# Altium footprint library XTL.PcbLib: 40 footprints (part 1 of 3)
Each footprint in its own frame and in the unit in brackets; x right, y up, seen from the top. Pads: shape width x height; smd on the part's side, far side on the other; paste and mask are expansions set on the pad; w line width, h text height; cw(c..) or ccw(c..) is an arc to the next point about the centre after c.
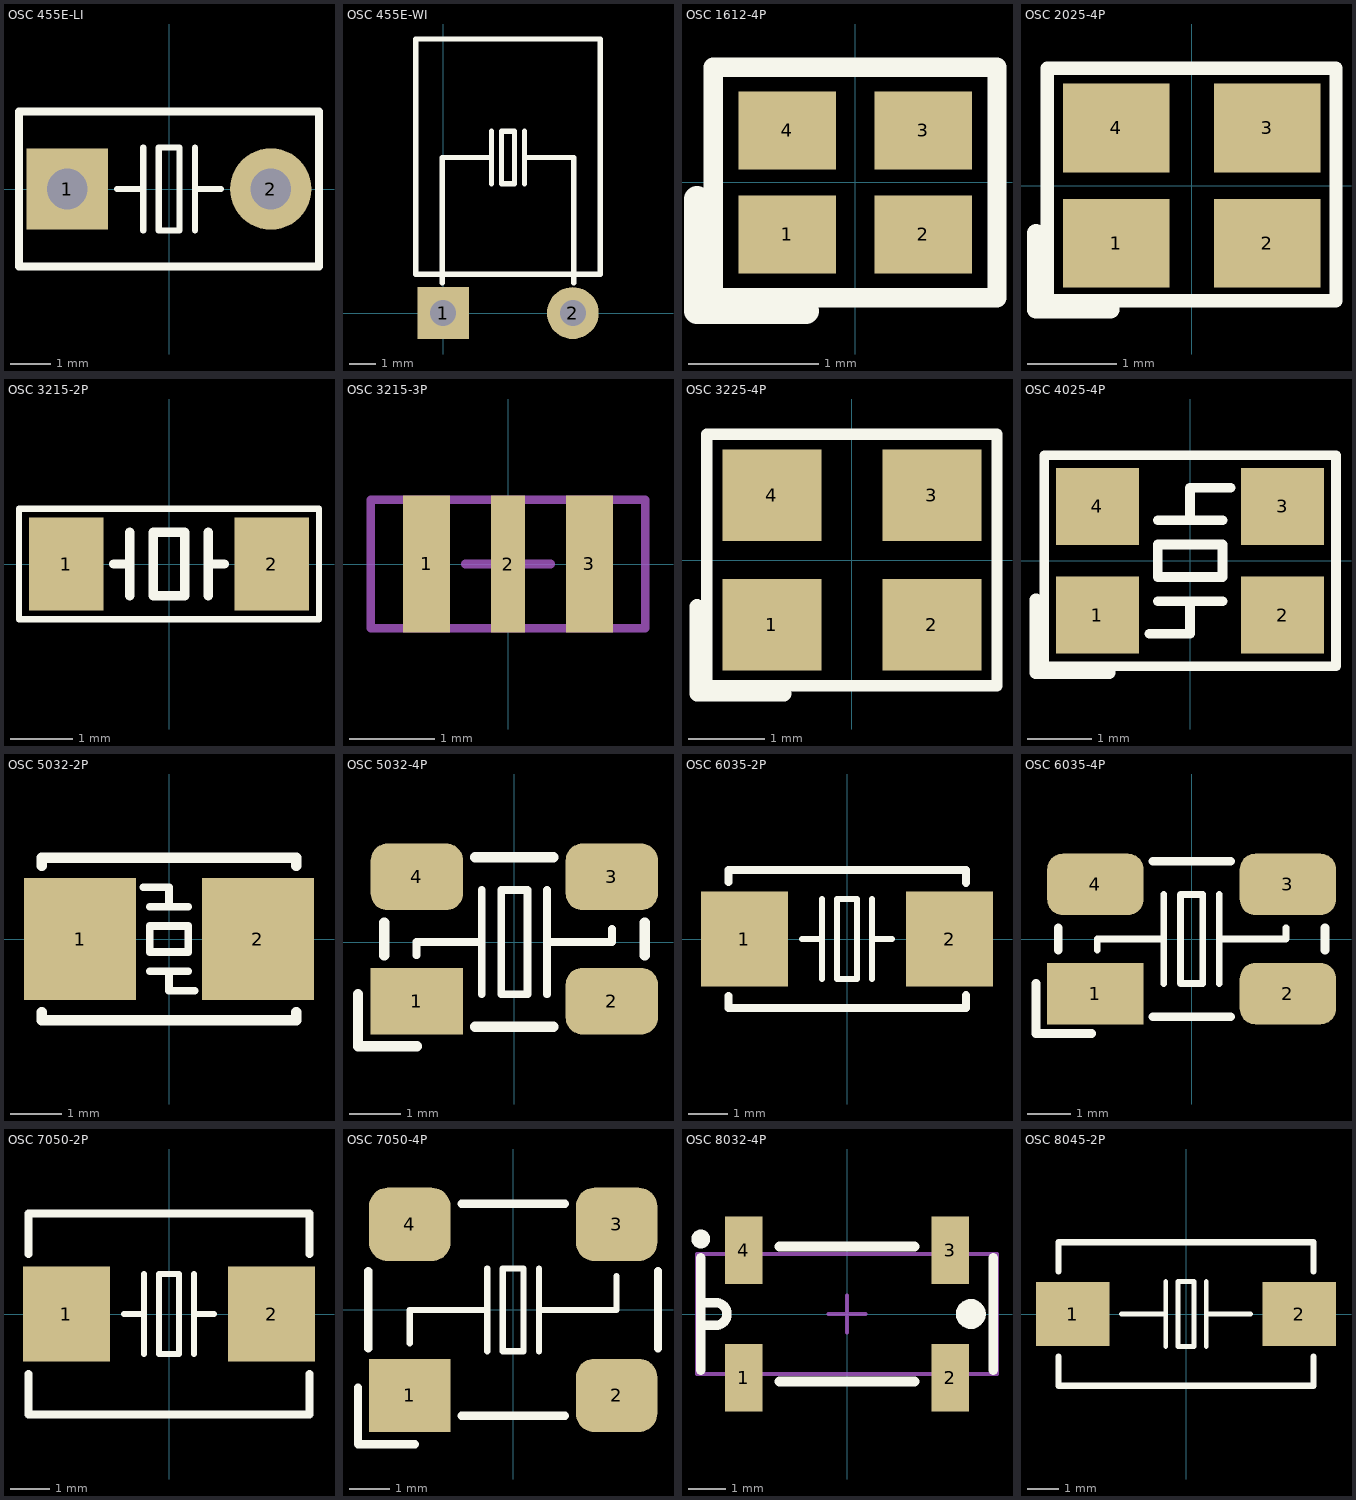
[diagram p0: the footprints below, top view; thin cyan lines are the x and y axes]

## OSC 455E-LI [mm]
pads (2):
  rect 2x2 hole 1 unplated: 1(-2.5,0)
  round 2 hole 1 unplated: 2(2.5,0)
Top Overlay:
  lines w0.152: -1.27,0 -0.635,0 ; -0.635,-1.016 -0.635,1.016 ; 0.635,-1.016 0.635,1.016 ; 0.635,0 1.27,0 ; -0.254,-1.016 0.254,-1.016 0.254,1.016 -0.254,1.016 -0.254,-1.016
  lines w0.203: -3.683,-1.905 -3.683,1.905 3.683,1.905 3.683,-1.905 -3.683,-1.905
3D body "OSC 455E-LI.STEP": height 9.05, standoff -3.45, extent -3.5,-1.722 3.5,1.778

## OSC 455E-WI [mm]
pads (2):
  rect 2x2 hole 1 unplated: 1(0,0)
  round 2 hole 1 unplated: 2(5,0)
Top Overlay:
  lines w0.203: -0.04,1.174 -0.04,1.5 -0.04,6 1.23,6 1.865,6 ; 1.865,4.984 1.865,7.016 ; 3.135,4.984 3.135,7.016 ; 3.135,6 3.77,6 5.04,6 5.04,1.5 5.04,1.174 ; -1.056,1.5 6.056,1.5 6.056,10.572 -1.056,10.572 -1.056,1.5 ; 2.246,4.984 2.246,7.016 2.754,7.016 2.754,4.984 2.246,4.984
3D body "OSC 455E-WI.STEP": height 3.65, standoff -3.45, extent -0.98,-0.258 6.02,10.342

## OSC 1612-4P [mm]
pads (4):
  rect 0.75x0.6 smd: 1(-0.525,-0.4) 2(0.525,-0.4) 3(0.525,0.4) 4(-0.525,0.4)
Top Overlay:
  lines w0.15: -1.092,-0.889 1.092,-0.889 1.092,0.889 -1.092,0.889 -1.092,-0.889
  lines w0.2: -1.219,-0.991 -0.381,-0.991 ; -1.219,-0.965 -1.219,-0.127
3D body "OSC 1612-4P.STEP": height 0.35, standoff -0.02, extent -0.8,-0.635 0.8,0.565

## OSC 2025-4P [mm]
pads (4):
  rect 1.2x1 smd: 1(-0.85,-0.65) 2(0.85,-0.65) 3(0.85,0.65) 4(-0.85,0.65)
Top Overlay:
  lines w0.15: -1.626,-1.295 1.626,-1.295 1.626,1.321 -1.626,1.321 -1.626,-1.295
  lines w0.2: -1.753,-1.397 -0.914,-1.397 ; -1.753,-1.372 -1.753,-0.533
3D body "OSC 2025-4P.STEP": height 0.55, standoff -0.02, extent -1.27,-1 1.23,1

## OSC 3215-2P [mm]
pads (2):
  rect 1.2x1.5 smd: 1(-1.65,0) 2(1.65,0)
Top Overlay:
  lines w0.1: -2.413,-0.889 -2.413,0.889 2.413,0.889 2.413,-0.889 -2.413,-0.889
  lines w0.152: -0.889,0 -0.635,0 ; -0.635,-0.508 -0.635,0.508 ; 0.635,-0.508 0.635,0.508 ; 0.635,0 0.889,0 ; -0.254,-0.508 0.254,-0.508 0.254,0.508 -0.254,0.508 -0.254,-0.508
3D body "OSC 3215-2P.STEP": height 0.61, standoff -0.01, extent -1.473,-0.762 1.727,0.738

## OSC 3215-3P [mm] "CSTCE16M0V53-R0"
pads (3):
  rect 0.55x1.6 smd: 1(-0.95,0) 3(0.95,0)
  rect 0.4x1.6 smd: 2(0,0)
Mechanical 15:
  lines w0.1: -0.5,0 0.5,0 ; 0,-0.5 0,0.5 ; -1.6,-0.75 -1.6,0.75 1.6,0.75 1.6,-0.75 -1.6,-0.75
3D body "XTAL ABS07.STEP": height 0.91, standoff 0, extent -1.61,-0.76 1.61,0.76

## OSC 3225-4P [mm]
pads (4):
  rect 1.3x1.2 smd: 1(-1.05,-0.85) 2(1.05,-0.85) 3(1.05,0.85) 4(-1.05,0.85)
Top Overlay:
  lines w0.15: -1.905,-1.651 -1.905,1.651 1.905,1.651 1.905,-1.651 -1.905,-1.651
  lines w0.2: -2.032,-1.753 -0.889,-1.753 ; -2.032,-1.727 -2.032,-0.61
3D body "OSC 3225-4P.STEP": height 0.7, standoff -0.02, extent -1.473,-1.27 1.727,1.23

## OSC 4025-4P [mm]
pads (4):
  rect 1.3x1.2 smd: 1(-1.45,-0.85) 2(1.45,-0.85) 3(1.45,0.85) 4(-1.45,0.85)
Top Overlay:
  lines w0.15: -2.286,-1.651 -2.286,1.651 2.286,1.651 2.286,-1.651 -2.286,-1.651
  lines w0.152: -0.635,-1.143 0,-1.143 0,-0.635 ; -0.508,-0.635 0.508,-0.635 ; -0.508,0.635 0.508,0.635 ; 0,0.635 0,1.143 0.635,1.143 ; -0.508,-0.254 -0.508,0.254 0.508,0.254 0.508,-0.254 -0.508,-0.254
  lines w0.2: -2.413,-1.753 -1.27,-1.753 ; -2.413,-1.727 -2.413,-0.61
3D body "OSC 4025-4P.STEP": height 0.7, standoff -0.02, extent -2,-1.27 2,1.23

## OSC 5032-2P [mm]
pads (2):
  rect 2.2x2.4 smd: 1(-1.75,0) 2(1.75,0)
Top Overlay:
  lines w0.152: -0.508,1.016 0,1.016 0,0.635 ; -0.381,-0.635 0.381,-0.635 ; -0.381,0.635 0.381,0.635 ; 0,-0.635 0,-1.016 0.381,-1.016 0.508,-1.016 ; -0.381,-0.254 0.381,-0.254 0.381,0.254 -0.381,0.254 -0.381,-0.254
  lines w0.203: -2.5,-1.437 -2.5,-1.6 2.5,-1.6 2.5,-1.437 ; -2.5,1.437 -2.5,1.6 2.5,1.6 2.5,1.437
3D body "OSC 5032-2P.STEP": height 0.86, standoff 0.04, extent -2.5,-1.524 2.5,1.676

## OSC 5032-4P [mm]
pads (4):
  rect 1.8x1.3 smd: 1(-1.9,-1.15)
  rrect50% 1.8x1.3 smd: 2(1.9,-1.15) 3(1.9,1.272) 4(-1.9,1.272)
Top Overlay:
  lines w0.152: -1.905,-0.254 -1.905,0 -1.397,0 -0.635,0 ; -0.635,-1.016 -0.635,1.016 ; 0.635,-1.016 0.635,1.016 ; 0.635,0 1.397,0 1.905,0 1.905,0.254 ; -0.254,-1.016 0.254,-1.016 0.254,1.016 -0.254,1.016 -0.254,-1.016
  lines w0.203: -3.048,-1.016 -3.048,-2.032 -1.905,-2.032 ; -2.54,-0.254 -2.54,0.381 ; -0.762,-1.651 0.762,-1.651 ; -0.762,1.651 0.762,1.651 ; 2.54,-0.254 2.54,0.381
3D body "OSC 5032-4P.STEP": height 0.86, standoff 0.03, extent -2.5,-1.651 2.5,1.549

## OSC 6035-2P [mm]
pads (2):
  rect 2.2x2.4 smd: 1(-2.6,0) 2(2.6,0)
Top Overlay:
  lines w0.152: -1.143,0 -0.635,0 ; -0.635,-1.016 -0.635,1.016 ; 0.635,-1.016 0.635,1.016 ; 0.635,0 1.143,0 ; -0.254,-1.016 -0.254,1.016 0.254,1.016 0.254,-1.016 -0.254,-1.016
  lines w0.203: -3,-1.445 -3,-1.75 3.02,-1.75 3.02,-1.425 ; -3,1.445 -3,1.75 3.02,1.75 3.02,1.425
3D body "OSC 6035-2P.STEP": height 1.06, standoff 0.04, extent -3,-1.651 3,1.849

## OSC 6035-4P [mm]
pads (4):
  rect 2.2x1.4 smd: 1(-2.2,-1.25)
  rrect50% 2.2x1.4 smd: 2(2.2,-1.25) 3(2.2,1.25) 4(-2.2,1.25)
Top Overlay:
  lines w0.152: -2.159,-0.254 -2.159,0 -1.397,0 -0.635,0 ; -0.635,-1.016 -0.635,1.016 ; 0.635,-1.016 0.635,1.016 ; 0.635,0 1.397,0 2.159,0 2.159,0.254 ; -0.254,-1.016 0.254,-1.016 0.254,1.016 -0.254,1.016 -0.254,-1.016
  lines w0.203: -3.556,-1.016 -3.556,-2.159 -2.286,-2.159 ; -3.048,-0.254 -3.048,0.254 ; -0.889,-1.778 0.889,-1.778 ; -0.889,1.778 0.889,1.778 ; 3.048,-0.254 3.048,0.254
3D body "OSC 6035-4P.STEP": height 1.06, standoff 0.03, extent -3,-1.905 3,1.595

## OSC 7050-2P [mm]
pads (2):
  rect 2.2x2.4 smd: 1(-2.6,0) 2(2.6,0)
Top Overlay:
  lines w0.152: -1.143,0 -0.635,0 ; -0.635,-1.016 -0.635,1.016 ; 0.635,-1.016 0.635,1.016 ; 0.635,0 1.143,0 ; -0.254,-1.016 -0.254,1.016 0.254,1.016 0.254,-1.016 -0.254,-1.016
  lines w0.203: -3.556,-1.524 -3.556,-2.54 3.556,-2.54 3.556,-1.524 ; -3.556,1.524 -3.556,2.54 3.556,2.54 3.556,1.524
3D body "OSC 7050-2P.STEP": height 1.36, standoff 0.04, extent -3.373,-2.46 3.627,2.54

## OSC 7050-4P [mm]
pads (4):
  rect 2x1.8 smd: 1(-2.54,-2.1)
  rrect50% 2x1.8 smd: 2(2.54,-2.1) 3(2.54,2.1) 4(-2.54,2.1)
Top Overlay:
  lines w0.152: -2.54,-0.821 -2.54,0 -1.397,0 -0.635,0 ; -0.635,-1.016 -0.635,1.016 ; 0.635,-1.016 0.635,1.016 ; 0.635,0 1.397,0 2.54,0 2.54,0.83 ; -0.254,-1.016 0.254,-1.016 0.254,1.016 -0.254,1.016 -0.254,-1.016
  lines w0.203: -3.81,-1.905 -3.81,-3.302 -2.413,-3.302 ; -3.556,-0.948 -3.556,0.957 ; -1.27,-2.599 1.27,-2.599 ; -1.27,2.608 1.27,2.608 ; 3.556,-0.948 3.556,0.957
3D body "OSC 7050-4P.STEP": height 1.36, standoff 0.04, extent -3.5,-2.667 3.5,2.333

## OSC 8032-4P [mm] "DMX-26S"
pads (4):
  rect 1x1.8 smd: 1(-2.75,-1.7) 2(2.75,-1.7) 3(2.75,1.7) 4(-2.75,1.7)
Top Overlay:
  circle w0.3: c-3.9,2 r0.1
  circle w0.4: c3.3,0 r0.2
  lines w0.254: -3.9,-1.5 -3.9,1.5 ; -3.9,-0.3 -3.5,-0.3 ccw(c-3.5,0) -3.5,0.3 -3.9,0.3 ; -1.8,-1.8 1.8,-1.8 ; -1.8,1.8 1.8,1.8 ; 3.9,-1.5 3.9,1.5
Mechanical 15:
  lines w0.1: -0.5,0 0.5,0 ; 0,-0.5 0,0.5 ; -4,-1.6 4,-1.6 4,1.6 -4,1.6 -4,-1.6
3D body "XTAL-CM250c.STEP": height 2.5, standoff 0.01, extent -3.95,-1.85 3.95,1.85

## OSC 8045-2P [mm]
pads (2):
  rect 2.3x2 smd: 1(-3.556,0) 2(3.556,0)
Top Overlay:
  lines w0.152: -2.032,0 -0.635,0 ; -0.635,-1.016 -0.635,1.016 ; 0.635,-1.016 0.635,1.016 ; 0.635,0 2.032,0 ; -0.254,-1.016 -0.254,1.016 0.254,1.016 0.254,-1.016 -0.254,-1.016
  lines w0.203: -4,-1.334 -4,-2.25 4,-2.25 4,-1.334 ; -4,1.334 -4,2.25 4,2.25 4,1.334
3D body "OSC 8045-2P.STEP": height 1.85, standoff 0.04, extent -4,-2.341 4,2.159